# Altium footprint library Miscellaneous THD.PcbLib: 216 footprints (part 6 of 15) (continued)
## HUBER-SUHNER_EDA-03664-V1-0_misc1 [mm] "Adapter Kit For PCB Mount for HUBER-SUHNER 23_SHV-50-0-2-133_NE"
height 41.2
pads (5):
  round 2.7 hole 2: 1(0,0)
  round 5.8 hole 3.2: 2(-6.35,-6.35) 2(-6.35,6.35) 2(6.35,-6.35) 2(6.35,6.35)
Top Overlay:
  circle w0.2: c0,0 r3.2
  circle w0.2: c0,0 r2.967
  circle w0.2: c0,0 r4.062
  circle w0.2: c0,0 r4.82
  lines w0.2: -8.75,-4.159 -8.75,4.159 ; -4.717,-0.99 -5.42,-0.99 cw(c0.691,0) -5.42,0.99 -4.717,0.99 ; -4.159,-8.75 4.159,-8.75 ; -4.159,8.75 4.159,8.75 ; 4.717,-0.99 5.42,-0.99 ccw(c0,0) 5.42,0.99 4.717,0.99 ; 8.75,-4.159 8.75,4.159
Mechanical 8:
  circle w0.1: c0,0 r1
  circle w0.1: c0,0 r1.35
  lines w0.1: -6.85,-6.35 -6.35,-6.35 ; -6.85,6.35 -6.35,6.35 ; -6.35,-6.85 -6.35,-6.35 ; -6.35,-5.85 -6.35,-6.35 ; -6.35,5.85 -6.35,6.35 ; -6.35,6.85 -6.35,6.35 ; -5.85,-6.35 -6.35,-6.35 ; -5.85,6.35 -6.35,6.35 ; -0.5,0 0,0 ; 0,-0.5 0,0 ; 0,0.5 0,0 ; 0.5,0 0,0 ; 5.85,-6.35 6.35,-6.35 ; 5.85,6.35 6.35,6.35 ; 6.35,-6.85 6.35,-6.35 ; 6.35,-5.85 6.35,-6.35 ; 6.35,5.85 6.35,6.35 ; 6.35,6.85 6.35,6.35 ; 6.85,-6.35 6.35,-6.35 ; 6.85,6.35 6.35,6.35
Mechanical 14:
  circle w0.1: c6.35,-6.35 r2.8
  circle w0.1: c6.35,-6.35 r1.45
  circle w0.1: c-6.35,-6.35 r2.8
  circle w0.1: c-6.35,-6.35 r1.45
  circle w0.1: c-6.35,6.35 r2.8
  circle w0.1: c-6.35,6.35 r1.45
  circle w0.1: c6.35,6.35 r2.8
  circle w0.1: c6.35,6.35 r1.45
  circle w0.1: c0,0 r3.2
  circle w0.1: c0,0 r2.967
  circle w0.1: c0,0 r4.062
  circle w0.1: c0,0 r4.82
  circle w0.1: c0,0 r1.013
  lines w0.1: -8.995,-7.269 -9.525,-6.35 -8.995,-5.431 ; -8.995,5.431 -9.525,6.35 -8.995,7.269 ; -8.753,4.912 -8.75,-4.908 ; -8.468,-8.181 -7.938,-9.1 -6.877,-9.1 ; -8.468,8.181 -7.938,9.1 -6.877,9.1 ; -5.823,-9.1 -4.762,-9.1 -4.232,-8.181 ; -5.823,9.1 -4.762,9.1 -4.56,8.75 ; -4.908,-8.75 4.908,-8.75 ; -4.908,8.75 4.908,8.75 ; -4.717,-0.99 -5.42,-0.99 cw(c0.691,0) -5.42,0.99 -4.717,0.99 ; 4.232,-8.181 4.762,-9.1 7.938,-9.1 8.468,-8.181 ; 4.56,8.75 4.762,9.1 5.823,9.1 ; 4.717,-0.99 5.42,-0.99 ccw(c0,0) 5.42,0.99 4.717,0.99 ; 6.877,9.1 7.938,9.1 8.468,8.181 ; 8.75,-4.908 8.75,4.908 ; 8.995,-7.269 9.525,-6.35 8.995,-5.431 ; 8.995,5.431 9.525,6.35 8.995,7.269 ; -7.512,-6.706 ccw(c-7.848,-6.35) -7.512,-5.994 cw(c-7.32,-5.79) -7.24,-5.522 ccw(c-7.099,-5.052) -6.622,-5.165 cw(c-6.35,-5.23) -6.078,-5.165 ccw(c-5.601,-5.052) -5.46,-5.522 cw(c-5.38,-5.79) -5.188,-5.994 ccw(c-4.852,-6.35) -5.188,-6.706 cw(c-5.38,-6.91) -5.46,-7.178 ccw(c-5.601,-7.648) -6.078,-7.535 cw(c-6.35,-7.47) -6.622,-7.535 ccw(c-7.099,-7.648) -7.24,-7.178 cw(c-7.32,-6.91) -7.512,-6.706 ; -7.512,5.994 ccw(c-7.848,6.35) -7.512,6.706 cw(c-7.32,6.91) -7.24,7.178 ccw(c-7.099,7.648) -6.622,7.535 cw(c-6.35,7.47) -6.078,7.535 ccw(c-5.601,7.648) -5.46,7.178 cw(c-5.38,6.91) -5.188,6.706 ccw(c-4.852,6.35) -5.188,5.994 cw(c-5.38,5.79) -5.46,5.522 ccw(c-5.601,5.052) -6.078,5.165 cw(c-6.35,5.23) -6.622,5.165 ccw(c-7.099,5.052) -7.24,5.522 cw(c-7.32,5.79) -7.512,5.994 ; 5.188,-6.706 ccw(c4.852,-6.35) 5.188,-5.994 cw(c5.38,-5.79) 5.46,-5.522 ccw(c5.601,-5.052) 6.078,-5.165 cw(c6.35,-5.23) 6.622,-5.165 ccw(c7.099,-5.052) 7.24,-5.522 cw(c7.32,-5.79) 7.512,-5.994 ccw(c7.848,-6.35) 7.512,-6.706 cw(c7.32,-6.91) 7.24,-7.178 ccw(c7.099,-7.648) 6.622,-7.535 cw(c6.35,-7.47) 6.078,-7.535 ccw(c5.601,-7.648) 5.46,-7.178 cw(c5.38,-6.91) 5.188,-6.706 ; 5.188,5.994 ccw(c4.852,6.35) 5.188,6.706 cw(c5.38,6.91) 5.46,7.178 ccw(c5.601,7.648) 6.078,7.535 cw(c6.35,7.47) 6.622,7.535 ccw(c7.099,7.648) 7.24,7.178 cw(c7.32,6.91) 7.512,6.706 ccw(c7.848,6.35) 7.512,5.994 cw(c7.32,5.79) 7.24,5.522 ccw(c7.099,5.052) 6.622,5.165 cw(c6.35,5.23) 6.078,5.165 ccw(c5.601,5.052) 5.46,5.522 cw(c5.38,5.79) 5.188,5.994
3D body "HUBER-SUHNER_EDA-03664-V1-0_misc1_Part1.stp": height 41.25, standoff -4, extent -9.525,-9.128 9.526,9.15
3D body "HUBER-SUHNER_EDA-03664-V1-0_misc1_Part2.stp": height 2.66, standoff -5.74, extent -9.45,-9.45 9.448,9.449

## ITB_16211701303000 [mm] "170 Poles, Extended Side, AdvancedMC-Plug-Connector"
height 2.44
pads (172):
  round 1.15 hole 0.55: 1(-31.5,-3.5) 2(-30.75,-0.75) 3(-30,-2) 4(-29.25,-3.5) 5(-28.5,-0.75) 6(-27.75,-2) 7(-27,-3.5) 8(-26.25,-0.75) 9(-25.5,-2) 10(-24.75,-3.5) 11(-24,-0.75) 12(-23.25,-2) 13(-22.5,-3.5) 14(-21.75,-0.75) 15(-21,-2) 16(-20.25,-3.5) 17(-19.5,-0.75) 18(-18.75,-2) 19(-18,-3.5) 20(-17.25,-0.75) 21(-16.5,-2) 22(-15.75,-3.5) 23(-15,-0.75) 24(-14.25,-2) 25(-13.5,-3.5) 26(-12.75,-0.75) 27(-12,-2) 28(-11.25,-3.5) 29(-10.5,-0.75) 30(-9.75,-2) 31(-9,-3.5) 32(-8.25,-0.75) 33(-7.5,-2) 34(-6.75,-3.5) 35(-6,-0.75) 36(-5.25,-2) 37(-4.5,-3.5) 38(-3.75,-0.75) 39(-3,-2) 40(-2.25,-3.5) 41(-1.5,-0.75) 42(-0.75,-2) 43(0,-3.5) 44(0.75,-0.75) 45(1.5,-2) 46(2.25,-3.5) 47(3,-0.75) 48(3.75,-2) 49(4.5,-3.5) 50(5.25,-0.75) 51(6,-2) 52(6.75,-3.5) 53(7.5,-0.75) 54(8.25,-2) 55(9,-3.5) 56(9.75,-0.75) 57(10.5,-2) 58(11.25,-3.5) 59(12,-0.75) 60(12.75,-2) 61(13.5,-3.5) 62(14.25,-0.75) 63(15,-2) 64(15.75,-3.5) 65(16.5,-0.75) 66(17.25,-2) 67(18,-3.5) 68(18.75,-0.75) 69(19.5,-2) 70(20.25,-3.5) 71(21,-0.75) 72(21.75,-2) 73(22.5,-3.5) 74(23.25,-0.75) 75(24,-2) 76(24.75,-3.5) 77(25.5,-0.75) 78(26.25,-2) 79(27,-3.5) 80(27.75,-0.75) 81(28.5,-2) 82(29.25,-3.5) 83(30,-0.75) 84(30.75,-2) 85(31.5,-3.5) 86(31.5,0.75) 87(30.75,3.5) 88(30,2.25) 89(29.25,0.75) 90(28.5,3.5) 91(27.75,2.25) 92(27,0.75) 93(26.25,3.5) 94(25.5,2.25) 95(24.75,0.75) 96(24,3.5) 97(23.25,2.25) 98(22.5,0.75) 99(21.75,3.5) 100(21,2.25) 101(20.25,0.75) 102(19.5,3.5) 103(18.75,2.25) 104(18,0.75) 105(17.25,3.5) 106(16.5,2.25) 107(15.75,0.75) 108(15,3.5) 109(14.25,2.25) 110(13.5,0.75) 111(12.75,3.5) 112(12,2.25) 113(11.25,0.75) 114(10.5,3.5) 115(9.75,2.25) 116(9,0.75) 117(8.25,3.5) 118(7.5,2.25) 119(6.75,0.75) 120(6,3.5) 121(5.25,2.25) 122(4.5,0.75) 123(3.75,3.5) 124(3,2.25) 125(2.25,0.75) 126(1.5,3.5) 127(0.75,2.25) 128(0,0.75) 129(-0.75,3.5) 130(-1.5,2.25) 131(-2.25,0.75) 132(-3,3.5) 133(-3.75,2.25) 134(-4.5,0.75) 135(-5.25,3.5) 136(-6,2.25) 137(-6.75,0.75) 138(-7.5,3.5) 139(-8.25,2.25) 140(-9,0.75) 141(-9.75,3.5) 142(-10.5,2.25) 143(-11.25,0.75) 144(-12,3.5) 145(-12.75,2.25) 146(-13.5,0.75) 147(-14.25,3.5) 148(-15,2.25) 149(-15.75,0.75) 150(-16.5,3.5) 151(-17.25,2.25) 152(-18,0.75) 153(-18.75,3.5) 154(-19.5,2.25) 155(-20.25,0.75) 156(-21,3.5) 157(-21.75,2.25) 158(-22.5,0.75) 159(-23.25,3.5) 160(-24,2.25) 161(-24.75,0.75) 162(-25.5,3.5) 163(-26.25,2.25) 164(-27,0.75) 165(-27.75,3.5) 166(-28.5,2.25) 167(-29.25,0.75) 168(-30,3.5) 169(-30.75,2.25) 170(-31.5,0.75)
  round 1 hole 1.5 unplated mask+0.25: 171(-33.775,5) 172(33.775,5)
Top Overlay:
  circle w0.2: c33.775,1.55 r0.735
  circle w0.2: c33.775,-0.95 r0.735
  circle w0.2: c33.775,-3.45 r0.735
  circle w0.2: c-33.775,-3.45 r0.735
  circle w0.2: c-33.775,-0.95 r0.735
  circle w0.2: c-33.775,1.55 r0.735
  lines w0.2: -33.49,-5.2 -31.99,-5.2 ; -32.6,0.078 -32.307,0.078 ; -32.6,3.922 -30.961,3.922 ; -32.525,-11.2 -31.74,-11.2 ; -32.525,-11.068 32.525,-11.068 ; -32.525,-10.935 32.525,-10.935 ; -32.525,-7.4 32.525,-7.4 ; -32.525,-6.872 32.525,-6.872 ; -32.525,-6.009 32.525,-6.009 ; -32.525,-5.6 -33,-5.6 cw(c-33,-5.1) -33.5,-5.1 -33.5,-4.9 -33.95,-4.9 cw(c-33.95,-3.9) -34.95,-3.9 -34.95,6.8 cw(c-34.45,6.8) -34.45,7.3 -33.1,7.3 cw(c-33.1,6.8) -32.6,6.8 -32.6,4.8 32.6,4.8 32.6,6.8 cw(c33.1,6.8) 33.1,7.3 34.45,7.3 cw(c34.45,6.8) 34.95,6.8 34.95,-3.9 cw(c33.95,-3.9) 33.95,-4.9 33.5,-4.9 33.49,-5.2 31.99,-5.2 ; -32.18,-0.05 -32.6,-0.05 -32.6,4.3 -30.68,4.3 ; -31.74,-11.068 -31.74,-14.98 -31.26,-14.98 -31.26,-11.068 ; -31.26,-11.2 -30.99,-11.2 ; -30.99,-11.068 -30.99,-13.58 -30.51,-13.58 -30.51,-11.068 ; -30.51,-11.2 -30.24,-11.2 ; -30.24,-11.068 -30.24,-13.58 -29.76,-13.58 -29.76,-11.068 ; -29.76,-11.2 -29.49,-11.2 ; -29.49,-11.068 -29.49,-13.58 -29.01,-13.58 -29.01,-11.068 ; -29.01,-11.2 -28.74,-11.2 ; -28.74,-11.068 -28.74,-13.58 -28.26,-13.58 -28.26,-11.068 ; -28.26,-11.2 -27.99,-11.2 ; -27.99,-11.068 -27.99,-13.58 -27.51,-13.58 -27.51,-11.068 ; -27.51,-11.2 27.51,-11.2 ; 27.51,-11.068 27.51,-13.58 27.99,-13.58 27.99,-11.068 ; 27.99,-11.2 28.26,-11.2 ; 28.26,-11.068 28.26,-13.58 28.74,-13.58 28.74,-11.068 ; 28.74,-11.2 29.01,-11.2 ; 29.01,-11.068 29.01,-14.98 29.49,-14.98 29.49,-11.068 ; 29.49,-11.2 29.76,-11.2 ; 29.76,-11.068 29.76,-13.58 30.24,-13.58 30.24,-11.068 ; 30.24,-11.2 30.51,-11.2 ; 30.51,-11.068 30.51,-13.58 30.99,-13.58 30.99,-11.068 ; 30.99,-11.2 31.26,-11.2 ; 31.26,-11.068 31.26,-14.98 31.74,-14.98 31.74,-11.068 ; 31.43,4.3 32.6,4.3 32.6,-0.05 32.18,-0.05 ; 31.711,3.922 32.6,3.922 ; 31.74,-11.2 32.525,-11.2 ; 32.026,-15.594 32.379,-15.246 ccw(c32.025,-14.893) 32.525,-14.893 32.525,-5.377 ; 32.049,-15.574 cw(c31.718,-15.2) 31.718,-15.7 -31.718,-15.7 cw(c-31.718,-15.2) -32.026,-15.594 -32.379,-15.246 cw(c-32.025,-14.893) -32.525,-14.893 -32.525,-5.377 -31.99,-5.359 -31.99,-5.093 31.99,-5.093 31.99,-5.359 32.525,-5.359 ; 32.308,0.079 32.6,0.079 ; 32.525,-5.6 33,-5.6 ccw(c33,-5.1) 33.5,-5.1
Mechanical 8:
  drawing of 704 lines, arcs and shapes, not listed
  text "PCB Edge" at -5.225,-7 h1.52
Mechanical 14:
  circle w0.1: c33.775,5 r0.735
  circle w0.1: c-33.775,5 r0.735
  circle w0.1: c33.775,1.55 r0.735
  circle w0.1: c33.775,-0.95 r0.735
  circle w0.1: c33.775,-3.45 r0.735
  circle w0.1: c-33.775,-3.45 r0.735
  circle w0.1: c-33.775,-0.95 r0.735
  circle w0.1: c-33.775,1.55 r0.735
  lines w0.1: -33.49,-5.2 -31.99,-5.2 ; -32.6,0.078 32.6,0.079 ; -32.6,3.922 32.6,3.922 ; -32.525,-11.2 -31.74,-11.2 ; -32.525,-11.068 32.525,-11.068 ; -32.525,-10.935 32.525,-10.935 ; -32.525,-7.4 32.525,-7.4 ; -32.525,-6.872 32.525,-6.872 ; -32.525,-6.009 32.525,-6.009 ; -32.525,-5.6 -33,-5.6 cw(c-33,-5.1) -33.5,-5.1 -33.5,-4.9 -33.95,-4.9 cw(c-33.95,-3.9) -34.95,-3.9 -34.95,6.8 cw(c-34.45,6.8) -34.45,7.3 -33.1,7.3 cw(c-33.1,6.8) -32.6,6.8 -32.6,4.8 32.6,4.8 32.6,6.8 cw(c33.1,6.8) 33.1,7.3 34.45,7.3 cw(c34.45,6.8) 34.95,6.8 34.95,-3.9 cw(c33.95,-3.9) 33.95,-4.9 33.5,-4.9 33.49,-5.2 31.99,-5.2 ; -31.74,-11.068 -31.74,-14.98 -31.26,-14.98 -31.26,-11.068 ; -31.26,-11.2 -30.99,-11.2 ; -30.99,-11.068 -30.99,-13.58 -30.51,-13.58 -30.51,-11.068 ; -30.51,-11.2 -30.24,-11.2 ; -30.24,-11.068 -30.24,-13.58 -29.76,-13.58 -29.76,-11.068 ; -29.76,-11.2 -29.49,-11.2 ; -29.49,-11.068 -29.49,-13.58 -29.01,-13.58 -29.01,-11.068 ; -29.01,-11.2 -28.74,-11.2 ; -28.74,-11.068 -28.74,-13.58 -28.26,-13.58 -28.26,-11.068 ; -28.26,-11.2 -27.99,-11.2 ; -27.99,-11.068 -27.99,-13.58 -27.51,-13.58 -27.51,-11.068 ; -27.51,-11.2 27.51,-11.2 ; 27.51,-11.068 27.51,-13.58 27.99,-13.58 27.99,-11.068 ; 27.99,-11.2 28.26,-11.2 ; 28.26,-11.068 28.26,-13.58 28.74,-13.58 28.74,-11.068 ; 28.74,-11.2 29.01,-11.2 ; 29.01,-11.068 29.01,-14.98 29.49,-14.98 29.49,-11.068 ; 29.49,-11.2 29.76,-11.2 ; 29.76,-11.068 29.76,-13.58 30.24,-13.58 30.24,-11.068 ; 30.24,-11.2 30.51,-11.2 ; 30.51,-11.068 30.51,-13.58 30.99,-13.58 30.99,-11.068 ; 30.99,-11.2 31.26,-11.2 ; 31.26,-11.068 31.26,-14.98 31.74,-14.98 31.74,-11.068 ; 31.74,-11.2 32.525,-11.2 ; 32.026,-15.594 32.379,-15.246 ccw(c32.025,-14.893) 32.525,-14.893 32.525,-5.377 ; 32.049,-15.574 cw(c31.718,-15.2) 31.718,-15.7 -31.718,-15.7 cw(c-31.718,-15.2) -32.026,-15.594 -32.379,-15.246 cw(c-32.025,-14.893) -32.525,-14.893 -32.525,-5.377 -31.99,-5.359 -31.99,-5.093 31.99,-5.093 31.99,-5.359 32.525,-5.359 ; 32.525,-5.6 33,-5.6 ccw(c33,-5.1) 33.5,-5.1 ; -32.6,-0.05 -32.6,4.3 32.6,4.3 32.6,-0.05 -32.6,-0.05
3D body "ITB_16211701303000.stp": height 2.42, standoff -2.18, extent -34.95,-15.7 34.95,7.3

## ITB_16231701301000 [mm] "170 Poles, AdvancedMC-Plug Connector (Basic Side Mounting)"
height 3.42
pads (172):
  round 1.15 hole 0.55: 1(31.5,2.1) 2(30.75,4.85) 3(30,3.6) 4(29.25,2.1) 5(28.5,4.85) 6(27.75,3.6) 7(27,2.1) 8(26.25,4.85) 9(25.5,3.6) 10(24.75,2.1) 11(24,4.85) 12(23.25,3.6) 13(22.5,2.1) 14(21.75,4.85) 15(21,3.6) 16(20.25,2.1) 17(19.5,4.85) 18(18.75,3.6) 19(18,2.1) 20(17.25,4.85) 21(16.5,3.6) 22(15.75,2.1) 23(15,4.85) 24(14.25,3.6) 25(13.5,2.1) 26(12.75,4.85) 27(12,3.6) 28(11.25,2.1) 29(10.5,4.85) 30(9.75,3.6) 31(9,2.1) 32(8.25,4.85) 33(7.5,3.6) 34(6.75,2.1) 35(6,4.85) 36(5.25,3.6) 37(4.5,2.1) 38(3.75,4.85) 39(3,3.6) 40(2.25,2.1) 41(1.5,4.85) 42(0.75,3.6) 43(0,2.1) 44(-0.75,4.85) 45(-1.5,3.6) 46(-2.25,2.1) 47(-3,4.85) 48(-3.75,3.6) 49(-4.5,2.1) 50(-5.25,4.85) 51(-6,3.6) 52(-6.75,2.1) 53(-7.5,4.85) 54(-8.25,3.6) 55(-9,2.1) 56(-9.75,4.85) 57(-10.5,3.6) 58(-11.25,2.1) 59(-12,4.85) 60(-12.75,3.6) 61(-13.5,2.1) 62(-14.25,4.85) 63(-15,3.6) 64(-15.75,2.1) 65(-16.5,4.85) 66(-17.25,3.6) 67(-18,2.1) 68(-18.75,4.85) 69(-19.5,3.6) 70(-20.25,2.1) 71(-21,4.85) 72(-21.75,3.6) 73(-22.5,2.1) 74(-23.25,4.85) 75(-24,3.6) 76(-24.75,2.1) 77(-25.5,4.85) 78(-26.25,3.6) 79(-27,2.1) 80(-27.75,4.85) 81(-28.5,3.6) 82(-29.25,2.1) 83(-30,4.85) 84(-30.75,3.6) 85(-31.5,2.1) 86(-31.5,-2.15) 87(-30.75,0.6) 88(-30,-0.65) 89(-29.25,-2.15) 90(-28.5,0.6) 91(-27.75,-0.65) 92(-27,-2.15) 93(-26.25,0.6) 94(-25.5,-0.65) 95(-24.75,-2.15) 96(-24,0.6) 97(-23.25,-0.65) 98(-22.5,-2.15) 99(-21.75,0.6) 100(-21,-0.65) 101(-20.25,-2.15) 102(-19.5,0.6) 103(-18.75,-0.65) 104(-18,-2.15) 105(-17.25,0.6) 106(-16.5,-0.65) 107(-15.75,-2.15) 108(-15,0.6) 109(-14.25,-0.65) 110(-13.5,-2.15) 111(-12.75,0.6) 112(-12,-0.65) 113(-11.25,-2.15) 114(-10.5,0.6) 115(-9.75,-0.65) 116(-9,-2.15) 117(-8.25,0.6) 118(-7.5,-0.65) 119(-6.75,-2.15) 120(-6,0.6) 121(-5.25,-0.65) 122(-4.5,-2.15) 123(-3.75,0.6) 124(-3,-0.65) 125(-2.25,-2.15) 126(-1.5,0.6) 127(-0.75,-0.65) 128(0,-2.15) 129(0.75,0.6) 130(1.5,-0.65) 131(2.25,-2.15) 132(3,0.6) 133(3.75,-0.65) 134(4.5,-2.15) 135(5.25,0.6) 136(6,-0.65) 137(6.75,-2.15) 138(7.5,0.6) 139(8.25,-0.65) 140(9,-2.15) 141(9.75,0.6) 142(10.5,-0.65) 143(11.25,-2.15) 144(12,0.6) 145(12.75,-0.65) 146(13.5,-2.15) 147(14.25,0.6) 148(15,-0.65) 149(15.75,-2.15) 150(16.5,0.6) 151(17.25,-0.65) 152(18,-2.15) 153(18.75,0.6) 154(19.5,-0.65) 155(20.25,-2.15) 156(21,0.6) 157(21.75,-0.65) 158(22.5,-2.15) 159(23.25,0.6) 160(24,-0.65) 161(24.75,-2.15) 162(25.5,0.6) 163(26.25,-0.65) 164(27,-2.15) 165(27.75,0.6) 166(28.5,-0.65) 167(29.25,-2.15) 168(30,0.6) 169(30.75,-0.65) 170(31.5,-2.15)
  round 1 hole 1.8 unplated mask+0.4: 171(-33.3,0) 172(33.3,0)
Top Overlay:
  lines w0.2: -33.5,-3.75 ccw(c-33,-3.75) -33,-4.25 -32.525,-4.25 -32.525,-13.543 ccw(c-32.025,-13.543) -32.379,-13.896 -32.071,-14.204 ccw(c-31.718,-13.85) -31.718,-14.35 30.368,-14.35 31.718,-14.35 ccw(c31.718,-13.85) 32.071,-14.204 32.379,-13.896 ccw(c32.025,-13.543) 32.525,-13.543 32.525,-4.25 32.993,-4.25 ; -33.5,-1.387 -33.5,-2 -33.1,-2 -33.1,-1.385 ; -33.5,1.387 -33.5,2 -33.1,2 -33.1,1.385 ; -31.6,6.15 31.6,6.15 ; 33,-4.25 ccw(c33,-3.75) 33.5,-3.75 ; 33.1,-1.387 33.1,-2 33.5,-2 33.5,-1.385 ; 33.1,1.387 33.1,2 33.5,2 33.5,1.385 ; 33.5,-3.55 33.95,-3.55 ccw(c33.95,-2.55) 34.95,-2.55 ; -31.74,-13.63 -31.74,-9.718 -31.26,-9.718 -31.26,-13.63 -31.74,-13.63 ; -30.99,-13.63 -30.99,-9.718 -30.51,-9.718 -30.51,-13.63 -30.99,-13.63 ; -30.24,-11.73 -30.24,-9.718 -29.76,-9.718 -29.76,-11.73 -30.24,-11.73 ; -29.49,-13.63 -29.49,-9.718 -29.01,-9.718 -29.01,-13.63 -29.49,-13.63 ; -28.74,-12.23 -28.74,-9.718 -28.26,-9.718 -28.26,-12.23 -28.74,-12.23 ; -27.99,-12.23 -27.99,-9.718 -27.51,-9.718 -27.51,-12.23 -27.99,-12.23 ; 27.51,-12.93 27.51,-9.718 27.99,-9.718 27.99,-12.93 27.51,-12.93 ; 28.26,-12.93 28.26,-9.718 28.74,-9.718 28.74,-12.93 28.26,-12.93 ; 29.01,-13.63 29.01,-9.718 29.49,-9.718 29.49,-13.63 29.01,-13.63 ; 29.76,-11.73 29.76,-9.718 30.24,-9.718 30.24,-11.73 29.76,-11.73 ; 30.51,-13.63 30.51,-9.718 30.99,-9.718 30.99,-13.63 30.51,-13.63 ; 31.26,-13.63 31.26,-9.718 31.74,-9.718 31.74,-13.63 31.26,-13.63
Mechanical 8:
  drawing of 714 lines, arcs and shapes, not listed
  text "PCB Edge" at -4.768,-5.75 h1.52
  text "167" at 29.514,-1.978 h0.5
  text "170" at 31.698,-1.925 h0.5
  text "169" at 31.047,-0.497 h0.5
  text "168" at 30.288,0.775 h0.5
  text "1" at 31.742,2.253 h0.5
  text "4" at 29.512,2.23 h0.5
  text "3" at 30.262,3.73 h0.5
  text "2" at 31.06,5.024 h0.5
  text "89" at -28.969,-1.99 h0.5
  text "86" at -31.194,-1.95 h0.5
  text "88" at -29.721,-0.477 h0.5
  text "87" at -30.494,0.744 h0.5
  text "85" at -31.315,2.233 h0.5
  text "82" at -29.039,2.244 h0.5
  text "84" at -30.534,3.744 h0.5
  text "83" at -29.786,5.004 h0.5
Mechanical 14:
  circle w0.1: c-33.55,6.95 r0.75
  circle w0.1: c-33.65,4.25 r0.735
  circle w0.1: c33.55,6.95 r0.75
  circle w0.1: c33.65,4.25 r0.735
  lines w0.1: -34.95,3.25 ccw(c-34.45,3.25) -34.45,2.75 -33.75,2.75 ccw(c-33.75,4.35) -32.15,4.35 -32.15,7.05 ccw(c-33.75,7.05) -33.75,8.65 ; -34.457,8.65 ccw(c-34.457,8.15) -34.957,8.15 -34.95,-2.55 ccw(c-33.95,-2.55) -33.95,-3.55 -33.5,-3.55 -33.5,-3.75 ccw(c-33,-3.75) -33,-4.25 -32.525,-4.25 -32.525,-13.543 ccw(c-32.025,-13.543) -32.379,-13.896 -32.071,-14.204 ccw(c-31.718,-13.85) -31.718,-14.35 30.368,-14.35 31.718,-14.35 ccw(c31.718,-13.85) 32.071,-14.204 32.379,-13.896 ccw(c32.025,-13.543) 32.525,-13.543 32.525,-4.25 32.993,-4.25 ; -34.45,8.65 -31.6,8.65 cw(c-31.6,8.15) -31.1,8.15 -31.1,6.15 ; -32.15,5.272 -32.15,1.3 32.15,1.3 32.15,4.35 ; -32.15,6.15 32.15,6.15 ; 31.1,6.15 31.1,8.15 cw(c31.6,8.15) 31.6,8.65 34.443,8.65 ; 33,-4.25 ccw(c33,-3.75) 33.5,-3.75 33.5,-3.55 33.95,-3.55 ccw(c33.95,-2.55) 34.95,-2.55 34.95,8.15 ; 32.15,4.35 ccw(c33.75,4.35) 33.75,2.75 34.45,2.75 ccw(c34.45,3.25) 34.95,3.25 34.95,8.15 ; 32.15,4.35 32.15,7.05 cw(c33.75,7.05) 33.75,8.65 34.45,8.65 cw(c34.45,8.15) 34.95,8.15 ; -33.5,-2 -33.1,-2 -33.1,2 -33.5,2 -33.5,-2 ; -31.74,-13.63 -31.74,-9.718 -31.26,-9.718 -31.26,-13.63 -31.74,-13.63 ; -30.99,-13.63 -30.99,-9.718 -30.51,-9.718 -30.51,-13.63 -30.99,-13.63 ; -30.24,-11.73 -30.24,-9.718 -29.76,-9.718 -29.76,-11.73 -30.24,-11.73 ; -29.49,-13.63 -29.49,-9.718 -29.01,-9.718 -29.01,-13.63 -29.49,-13.63 ; -28.74,-12.23 -28.74,-9.718 -28.26,-9.718 -28.26,-12.23 -28.74,-12.23 ; -27.99,-12.23 -27.99,-9.718 -27.51,-9.718 -27.51,-12.23 -27.99,-12.23 ; 27.51,-12.93 27.51,-9.718 27.99,-9.718 27.99,-12.93 27.51,-12.93 ; 28.26,-12.93 28.26,-9.718 28.74,-9.718 28.74,-12.93 28.26,-12.93 ; 29.01,-13.63 29.01,-9.718 29.49,-9.718 29.49,-13.63 29.01,-13.63 ; 29.76,-11.73 29.76,-9.718 30.24,-9.718 30.24,-11.73 29.76,-11.73 ; 30.51,-13.63 30.51,-9.718 30.99,-9.718 30.99,-13.63 30.51,-13.63 ; 31.26,-13.63 31.26,-9.718 31.74,-9.718 31.74,-13.63 31.26,-13.63 ; 33.1,-2 33.5,-2 33.5,2 33.1,2 33.1,-2
3D body "ITB_16231701301000.stp": height 3.42, standoff -2.63, extent -34.95,-14.35 34.95,8.65

## ITB_16241701301000 [mm] "170 Poles, MCH-Plug Connector (Basic Side)"
height 7.63
pads (172):
  round 1.15 hole 0.55: 1(31.5,2.1) 2(30.75,4.85) 3(30,3.6) 4(29.25,2.1) 5(28.5,4.85) 6(27.75,3.6) 7(27,2.1) 8(26.25,4.85) 9(25.5,3.6) 10(24.75,2.1) 11(24,4.85) 12(23.25,3.6) 13(22.5,2.1) 14(21.75,4.85) 15(21,3.6) 16(20.25,2.1) 17(19.5,4.85) 18(18.75,3.6) 19(18,2.1) 20(17.25,4.85) 21(16.5,3.6) 22(15.75,2.1) 23(15,4.85) 24(14.25,3.6) 25(13.5,2.1) 26(12.75,4.85) 27(12,3.6) 28(11.25,2.1) 29(10.5,4.85) 30(9.75,3.6) 31(9,2.1) 32(8.25,4.85) 33(7.5,3.6) 34(6.75,2.1) 35(6,4.85) 36(5.25,3.6) 37(4.5,2.1) 38(3.75,4.85) 39(3,3.6) 40(2.25,2.1) 41(1.5,4.85) 42(0.75,3.6) 43(0,2.1) 44(-0.75,4.85) 45(-1.5,3.6) 46(-2.25,2.1) 47(-3,4.85) 48(-3.75,3.6) 49(-4.5,2.1) 50(-5.25,4.85) 51(-6,3.6) 52(-6.75,2.1) 53(-7.5,4.85) 54(-8.25,3.6) 55(-9,2.1) 56(-9.75,4.85) 57(-10.5,3.6) 58(-11.25,2.1) 59(-12,4.85) 60(-12.75,3.6) 61(-13.5,2.1) 62(-14.25,4.85) 63(-15,3.6) 64(-15.75,2.1) 65(-16.5,4.85) 66(-17.25,3.6) 67(-18,2.1) 68(-18.75,4.85) 69(-19.5,3.6) 70(-20.25,2.1) 71(-21,4.85) 72(-21.75,3.6) 73(-22.5,2.1) 74(-23.25,4.85) 75(-24,3.6) 76(-24.75,2.1) 77(-25.5,4.85) 78(-26.25,3.6) 79(-27,2.1) 80(-27.75,4.85) 81(-28.5,3.6) 82(-29.25,2.1) 83(-30,4.85) 84(-30.75,3.6) 85(-31.5,2.1) 86(-31.5,-2.15) 87(-30.75,0.6) 88(-30,-0.65) 89(-29.25,-2.15) 90(-28.5,0.6) 91(-27.75,-0.65) 92(-27,-2.15) 93(-26.25,0.6) 94(-25.5,-0.65) 95(-24.75,-2.15) 96(-24,0.6) 97(-23.25,-0.65) 98(-22.5,-2.15) 99(-21.75,0.6) 100(-21,-0.65) 101(-20.25,-2.15) 102(-19.5,0.6) 103(-18.75,-0.65) 104(-18,-2.15) 105(-17.25,0.6) 106(-16.5,-0.65) 107(-15.75,-2.15) 108(-15,0.6) 109(-14.25,-0.65) 110(-13.5,-2.15) 111(-12.75,0.6) 112(-12,-0.65) 113(-11.25,-2.15) 114(-10.5,0.6) 115(-9.75,-0.65) 116(-9,-2.15) 117(-8.25,0.6) 118(-7.5,-0.65) 119(-6.75,-2.15) 120(-6,0.6) 121(-5.25,-0.65) 122(-4.5,-2.15) 123(-3.75,0.6) 124(-3,-0.65) 125(-2.25,-2.15) 126(-1.5,0.6) 127(-0.75,-0.65) 128(0,-2.15) 129(0.75,0.6) 130(1.5,-0.65) 131(2.25,-2.15) 132(3,0.6) 133(3.75,-0.65) 134(4.5,-2.15) 135(5.25,0.6) 136(6,-0.65) 137(6.75,-2.15) 138(7.5,0.6) 139(8.25,-0.65) 140(9,-2.15) 141(9.75,0.6) 142(10.5,-0.65) 143(11.25,-2.15) 144(12,0.6) 145(12.75,-0.65) 146(13.5,-2.15) 147(14.25,0.6) 148(15,-0.65) 149(15.75,-2.15) 150(16.5,0.6) 151(17.25,-0.65) 152(18,-2.15) 153(18.75,0.6) 154(19.5,-0.65) 155(20.25,-2.15) 156(21,0.6) 157(21.75,-0.65) 158(22.5,-2.15) 159(23.25,0.6) 160(24,-0.65) 161(24.75,-2.15) 162(25.5,0.6) 163(26.25,-0.65) 164(27,-2.15) 165(27.75,0.6) 166(28.5,-0.65) 167(29.25,-2.15) 168(30,0.6) 169(30.75,-0.65) 170(31.5,-2.15)
  round 1 hole 1.8 unplated mask+0.4: 171(-33.3,0) 172(33.3,0)
Top Overlay:
  lines w0.2: -33.5,-3.75 ccw(c-33,-3.75) -33,-4.25 -32.525,-4.25 -32.525,-13.543 ccw(c-32.025,-13.543) -32.379,-13.896 -32.026,-14.244 ccw(c-31.718,-13.85) -31.718,-14.35 31.718,-14.35 ccw(c31.718,-13.85) 32.026,-14.244 32.379,-13.896 ccw(c32.025,-13.543) 32.525,-13.543 32.525,-4.25 33,-4.25 ccw(c33,-3.75) 33.5,-3.75 ; -33.5,-1.285 -33.5,-2 -33.1,-2 -33.1,-1.285 ; -33.5,1.285 -33.5,2 -33.1,2 -33.1,1.285 ; -31.6,6.15 31.6,6.15 ; -31.1,6.15 -31.1,7.5 ; 31.1,6.15 31.1,7.5 ; 33.1,-1.285 33.1,-2 33.5,-2 33.5,-1.285 ; 33.1,1.285 33.1,2 33.5,2 33.5,1.285 ; -31.74,-13.63 -31.26,-13.63 -31.26,-9.718 -31.74,-9.718 -31.74,-13.63 ; -30.99,-12.23 -30.51,-12.23 -30.51,-9.718 -30.99,-9.718 -30.99,-12.23 ; -30.24,-12.23 -30.24,-9.718 -29.76,-9.718 -29.76,-12.23 -30.24,-12.23 ; -29.49,-13.63 -29.49,-9.718 -29.01,-9.718 -29.01,-13.63 -29.49,-13.63 ; -28.74,-12.23 -28.26,-12.23 -28.26,-9.718 -28.74,-9.718 -28.74,-12.23 ; -27.99,-12.23 -27.99,-9.718 -27.51,-9.718 -27.51,-12.23 -27.99,-12.23 ; 27.51,-12.23 27.99,-12.23 27.99,-9.718 27.51,-9.718 27.51,-12.23 ; 28.26,-12.23 28.74,-12.23 28.74,-9.718 28.26,-9.718 28.26,-12.23 ; 29.01,-12.23 29.49,-12.23 29.49,-9.718 29.01,-9.718 29.01,-12.23 ; 29.76,-12.23 30.24,-12.23 30.24,-9.718 29.76,-9.718 29.76,-12.23 ; 30.51,-12.23 30.99,-12.23 30.99,-9.718 30.51,-9.718 30.51,-12.23 ; 31.26,-13.63 31.74,-13.63 31.74,-9.718 31.26,-9.718 31.26,-13.63
Mechanical 8:
  drawing of 735 lines, arcs and shapes, not listed
  text "170" at 31.705,-1.925 h0.5
  text "167" at 29.522,-1.978 h0.5
  text "169" at 31.054,-0.497 h0.5
  text "168" at 30.295,0.775 h0.5
  text "4" at 29.52,2.23 h0.5
  text "1" at 31.749,2.253 h0.5
  text "3" at 30.27,3.73 h0.5
  text "2" at 31.067,5.024 h0.5
  text "86" at -31.187,-1.95 h0.5
  text "89" at -28.962,-1.99 h0.5
  text "88" at -29.713,-0.477 h0.5
  text "87" at -30.487,0.744 h0.5
  text "82" at -29.032,2.244 h0.5
  text "85" at -31.308,2.233 h0.5
  text "84" at -30.526,3.744 h0.5
  text "83" at -29.779,5.004 h0.5
  text "PCB Edge" at -4.675,-5.5 h1.52
Mechanical 14:
  circle w0.1: c-33.55,6.95 r0.75
  circle w0.1: c-33.65,4.25 r0.735
  circle w0.1: c-33.55,6.95 r0.55
  circle w0.1: c33.55,6.95 r0.55
  circle w0.1: c33.55,6.95 r0.75
  circle w0.1: c33.65,4.25 r0.735
  lines w0.1: -34.95,3.25 ccw(c-34.45,3.25) -34.45,2.75 -33.75,2.75 ccw(c-33.75,4.35) -32.15,4.35 ; -33.75,8.65 cw(c-33.75,7.05) -32.15,7.05 -32.15,1.3 32.15,1.3 32.15,7.05 cw(c33.75,7.05) 33.75,8.65 ; -32.15,6.15 32.15,6.15 ; -31.1,6.15 -31.1,8.15 ccw(c-31.6,8.15) -31.6,8.65 -34.45,8.65 ccw(c-34.45,8.15) -34.95,8.15 -34.95,-2.55 ccw(c-33.95,-2.55) -33.95,-3.55 -33.5,-3.55 -33.5,-3.75 ccw(c-33,-3.75) -33,-4.25 -32.525,-4.25 -32.525,-13.543 ccw(c-32.025,-13.543) -32.379,-13.896 -32.026,-14.244 ccw(c-31.718,-13.85) -31.718,-14.35 31.718,-14.35 ccw(c31.718,-13.85) 32.026,-14.244 32.379,-13.896 ccw(c32.025,-13.543) 32.525,-13.543 32.525,-4.25 33,-4.25 ccw(c33,-3.75) 33.5,-3.75 33.5,-3.55 33.95,-3.55 ccw(c33.95,-2.55) 34.95,-2.55 34.95,8.15 ccw(c34.45,8.15) 34.45,8.65 31.6,8.65 ccw(c31.6,8.15) 31.1,8.15 31.1,6.15 ; 32.15,4.35 ccw(c33.75,4.35) 33.75,2.75 34.45,2.75 ccw(c34.45,3.25) 34.95,3.25 ; -33.5,-2 -33.1,-2 -33.1,2 -33.5,2 -33.5,-2 ; -31.74,-13.63 -31.26,-13.63 -31.26,-9.718 -31.74,-9.718 -31.74,-13.63 ; -30.99,-12.23 -30.51,-12.23 -30.51,-9.718 -30.99,-9.718 -30.99,-12.23 ; -30.24,-12.23 -30.24,-9.718 -29.76,-9.718 -29.76,-12.23 -30.24,-12.23 ; -29.49,-13.63 -29.49,-9.718 -29.01,-9.718 -29.01,-13.63 -29.49,-13.63 ; -28.74,-12.23 -28.26,-12.23 -28.26,-9.718 -28.74,-9.718 -28.74,-12.23 ; -27.99,-12.23 -27.99,-9.718 -27.51,-9.718 -27.51,-12.23 -27.99,-12.23 ; 27.51,-12.23 27.99,-12.23 27.99,-9.718 27.51,-9.718 27.51,-12.23 ; 28.26,-12.23 28.74,-12.23 28.74,-9.718 28.26,-9.718 28.26,-12.23 ; 29.01,-12.23 29.49,-12.23 29.49,-9.718 29.01,-9.718 29.01,-12.23 ; 29.76,-12.23 30.24,-12.23 30.24,-9.718 29.76,-9.718 29.76,-12.23 ; 30.51,-12.23 30.99,-12.23 30.99,-9.718 30.51,-9.718 30.51,-12.23 ; 31.26,-13.63 31.74,-13.63 31.74,-9.718 31.26,-9.718 31.26,-13.63 ; 33.1,-2 33.5,-2 33.5,2 33.1,2 33.1,-2
3D body "ITB_16241701301000.stp": height 3.42, standoff -6.4, extent -34.95,-14.35 34.95,8.65